# Altium footprint library WTR-PCB_LIB.PcbLib: 44 footprints (part 2 of 3)
Each footprint in its own frame and in the unit in brackets; x right, y up, seen from the top. Pads: shape width x height; smd on the part's side, far side on the other; paste and mask are expansions set on the pad; w line width, h text height; cw(c..) or ccw(c..) is an arc to the next point about the centre after c.
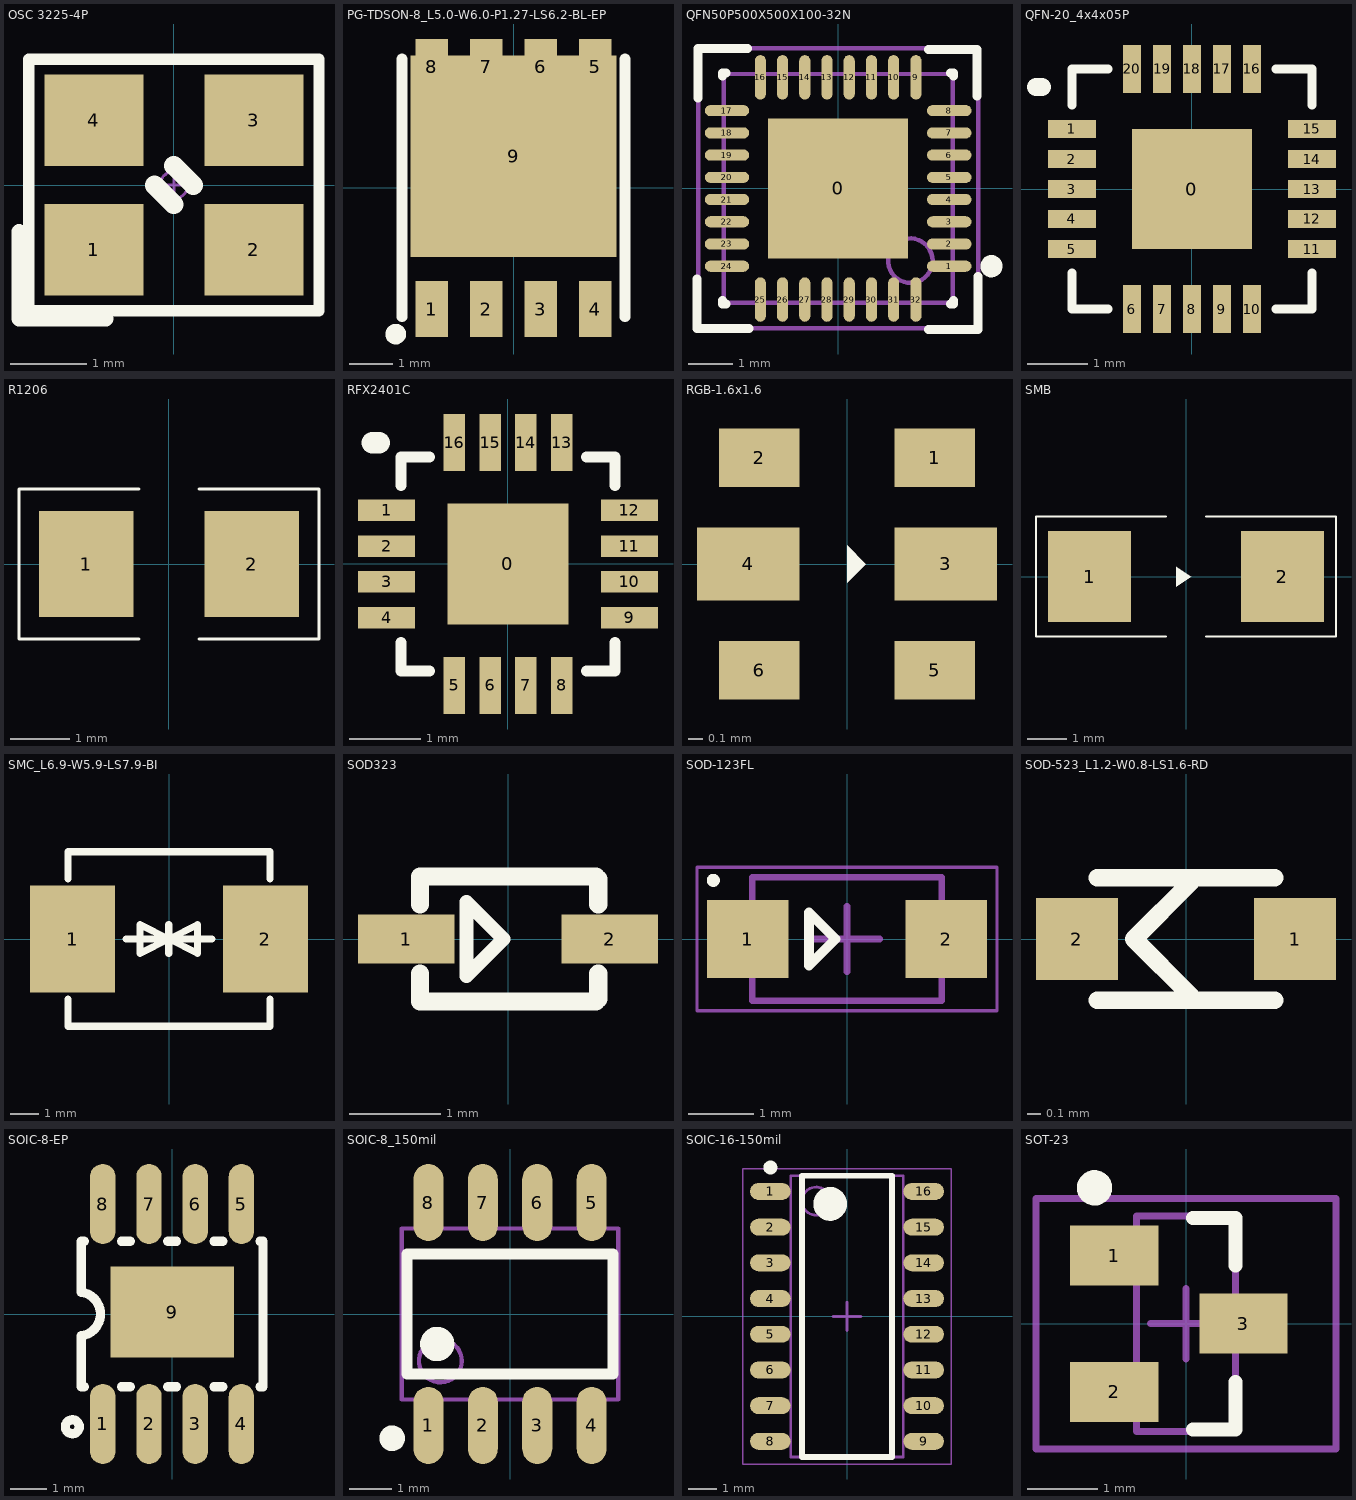
[diagram p1: the footprints below, top view; thin cyan lines are the x and y axes]

## OSC 3225-4P [mm] "3.2*2.5*0.7mm(长宽高)                         淘宝ID:黄晶宝石"
pads (4):
  rect 1.3x1.2 smd: 1(-1.05,-0.85) 2(1.05,-0.85) 3(1.05,0.85) 4(-1.05,0.85)
Top Overlay:
  lines w0.15: -1.905,-1.651 1.905,-1.651 1.905,1.651 -1.905,1.651 -1.905,-1.651
  lines w0.2: -2.032,-1.753 -0.889,-1.753 ; -2.032,-1.727 -2.032,-0.61
  lines w0.254: -0.254,0 0,-0.254 ; 0,0.254 0.254,0
Mechanical 15:
  circle w0.04: c0,0 r0.18
  lines w0.04: -0.254,0 0.254,0 ; 0,-0.254 0,0.254
3D body "OSC 3225-4.STEP": height 0.7, standoff -0.02, extent -1.6,-1.25 1.6,1.25

## PG-TDSON-8_L5.0-W6.0-P1.27-LS6.2-BL-EP [mil]
pads (9):
  rect 29.5x51.2 smd: 1(-75,-111) 2(-25,-111) 3(25,-111) 4(75,-111) 5(75,111) 6(25,111) 7(-25,111) 8(-75,111)
  rect 189x185 smd: 9(0,29)
Top Overlay:
  circle w10: c-108,-134 r4.47
  lines w10: -102.36,-118.11 -102.36,118.11 ; 102.36,-118.11 102.36,118.11

## QFN50P500X500X100-32N [mm]
pads (33):
  rect 3.15x3.15 smd: 0(0,0)
  oval 1x0.25 smd: 1(2.5,-1.75) 2(2.5,-1.25) 3(2.5,-0.75) 4(2.5,-0.25) 5(2.5,0.25) 6(2.5,0.75) 7(2.5,1.25) 8(2.5,1.75) 17(-2.5,1.75) 18(-2.5,1.25) 19(-2.5,0.75) 20(-2.5,0.25) 21(-2.5,-0.25) 22(-2.5,-0.75) 23(-2.5,-1.25) 24(-2.5,-1.75)
  oval 0.25x1 smd: 9(1.75,2.5) 10(1.25,2.5) 11(0.75,2.5) 12(0.25,2.5) 13(-0.25,2.5) 14(-0.75,2.5) 15(-1.25,2.5) 16(-1.75,2.5) 25(-1.75,-2.5) 26(-1.25,-2.5) 27(-0.75,-2.5) 28(-0.25,-2.5) 29(0.25,-2.5) 30(0.75,-2.5) 31(1.25,-2.5) 32(1.75,-2.5)
Top Overlay:
  circle w0.25: c3.45,-1.75 r0.125
  lines w0.2: -3.175,-2.032 -3.175,-3.15 -2.007,-3.15 ; -3.15,2.032 -3.15,3.15 -2.032,3.15 ; -2.6,-2.525 -2.6,-2.6 -2.525,-2.6 ; -2.6,2.525 -2.6,2.6 -2.525,2.6 ; 2.032,-3.175 3.15,-3.175 3.15,-1.981 ; 2.032,3.124 3.124,3.124 3.124,2.083 ; 2.525,-2.6 2.6,-2.6 2.6,-2.525 ; 2.525,2.6 2.6,2.6 2.6,2.525
Mechanical 13:
  circle w0.1: c1.625,-1.625 r0.5
  lines w0.1: -2.575,-2.575 -2.575,2.575 2.575,2.575 2.575,-2.575 -2.575,-2.575
Mechanical 15:
  lines w0.1: -0.5,0 0.5,0 ; 0,-0.5 0,0.5 ; -3.15,-3.15 -3.15,3.15 3.15,3.15 3.15,-3.15 -3.15,-3.15
3D body "User Library-qfn32-5x5__ _________.STEP": height 0.8, standoff 0, extent -2.501,-2.51 2.519,2.51

## QFN-20_4x4x05P [mm]
pads (21):
  rect 2x2 smd: 0(0,0)
  rect 0.8x0.3 smd: 1(-2,1) 2(-2,0.5) 3(-2,0) 4(-2,-0.5) 5(-2,-1) 11(2,-1) 12(2,-0.5) 13(2,0) 14(2,0.5) 15(2,1)
  rect 0.3x0.8 smd: 6(-1,-2) 7(-0.5,-2) 8(0,-2) 9(0.5,-2) 10(1,-2) 16(1,2) 17(0.5,2) 18(0,2) 19(-0.5,2) 20(-1,2)
Top Overlay:
  lines w0.152: -2,-1.4 -2,-2 -1.4,-2 ; -2,1.4 -2,2 -1.4,2 ; 1.4,-2 2,-2 2,-1.4 ; 1.4,2 2,2 2,1.4
  lines w0.3: -2.6,1.7 -2.5,1.7
3D body "User Library-QFN20_4x4x0_8.STEP": height 0.78, standoff -0.02, extent -2.01,-2.01 2.01,2.01

## R1206 [mm]
height 1
pads (2):
  rect 1.6x1.8 smd: 1(-1.4,0) 2(1.4,0)
Top Overlay:
  lines w0.051: -0.508,-1.27 -2.54,-1.27 -2.54,1.27 -0.508,1.27 ; 0.508,-1.27 2.54,-1.27 2.54,1.27 0.508,1.27
3D body "R1206封?": height 1, standoff -0.01, extent -1.6,-0.813 1.6,0.797

## RFX2401C [mm]
pads (17):
  rect 1.7x1.7 smd: 0(0,0)
  rect 0.8x0.3 smd: 1(-1.7,0.75) 2(-1.7,0.25) 3(-1.7,-0.25) 4(-1.7,-0.75) 9(1.7,-0.75) 10(1.7,-0.25) 11(1.7,0.25) 12(1.7,0.75)
  rect 0.3x0.8 smd: 5(-0.75,-1.7) 6(-0.25,-1.7) 7(0.25,-1.7) 8(0.75,-1.7) 13(0.75,1.7) 14(0.25,1.7) 15(-0.25,1.7) 16(-0.75,1.7)
Top Overlay:
  lines w0.152: -1.5,-1.1 -1.5,-1.5 -1.1,-1.5 ; -1.5,1.1 -1.5,1.5 -1.1,1.5 ; 1.1,-1.5 1.5,-1.5 1.5,-1.1 ; 1.1,1.5 1.5,1.5 1.5,1.1
  lines w0.3: -1.9,1.7 -1.8,1.7
3D body: height 0.25, standoff 0, extent 1.016,0.635 1.016,0.635
3D body: height 0.25, standoff 0, extent 1.016,0.635 1.016,0.635
3D body "ALSRobot-QFN16 3x3.STEP": height 0.9, standoff 0, extent -1.521,-1.518 1.521,1.524

## RGB-1.6x1.6 [mm]
pads (6):
  rect 0.55x0.4 smd: 1(0.6,0.725) 2(-0.6,0.725) 5(0.6,-0.725) 6(-0.6,-0.725)
  rect 0.7x0.5 smd: 3(0.675,0) 4(-0.675,0)
Top Layer:
  region: -0.127,0.762 -0.127,0.889
Top Overlay:
  region: 0,0.127 0,-0.127 0.127,0

## SMB [mm]
height 1
pads (2):
  rect 2.1x2.3 smd: 1(-2.45,0) 2(2.45,0)
Top Layer:
  region: -0.254,-0.254 -0.127,-0.254
  pour cut-out: 1.524,2.159
Top Overlay:
  region: -0.254,0.254 -0.254,-0.254 0.127,0
  lines w0.051: -0.508,-1.524 -3.81,-1.524 -3.81,1.524 -0.508,1.524 ; 0.508,-1.524 3.81,-1.524 3.81,1.524 0.508,1.524
3D body "SMBJ30A.stp": height 2.61, standoff 0, extent -2.7,-1.81 2.7,1.81

## SMC_L6.9-W5.9-LS7.9-BI [mm]
pads (2):
  rect 3.03x3.82 smd: 1(-3.435,0) 2(3.435,0)
Top Overlay:
  lines w0.254: -3.6,-2.141 -3.6,-3.11 3.6,-3.11 3.6,-2.141 ; -3.6,2.141 -3.6,3.11 3.6,3.11 3.6,2.141 ; -1.536,0 0.496,0 ; -0.508,0 1.524,0 ; -0.012,-0.508 -0.012,0.508 -0.012,0 ; 0,0.508 0,-0.508 0,0 ; -0.012,0 -1.028,0.508 -1.028,-0.508 -0.012,0 ; 0,0 1.016,0.508 1.016,-0.508 0,0

## SOD323 [mm]
pads (2):
  rect 1.06x0.54 smd: 1(-1.118,0) 2(1.118,0)
Top Overlay:
  lines w0.152: -0.457,-0.406 -0.051,0 -0.457,0.406 -0.457,-0.406
  lines w0.2: -0.965,-0.381 -0.965,-0.686 0.965,-0.686 ; -0.965,0.381 -0.965,0.686 0.965,0.686 ; 0.991,-0.66 0.991,-0.381 ; 0.991,0.381 0.991,0.66
3D body "User Library-SOD2513X11.STEP": height 1.1, standoff 0, extent -1.35,-0.615 1.35,0.635

## SOD-123FL [mm] "SODFL, 2-Leads, Body 1.80x3.70mm, IPC Medium Density"
height 1.1
pads (2):
  rect 1.25x1.2 smd: 1(-1.525,0) 2(1.525,0)
Top Overlay:
  circle w0.1: c-2.05,0.9 r0.05
  lines w0.152: -0.584,-0.406 -0.178,0 -0.584,0.406 -0.584,-0.406
Top Assembly:
  lines w0.1: -1.45,-0.95 1.45,-0.95 1.45,0.95 -1.45,0.95 -1.45,-0.95
Top Courtyard:
  lines w0.05: -2.3,-1.1 2.3,-1.1 2.3,1.1 -2.3,1.1 -2.3,-1.1
  lines w0.1: -0.5,0 0.5,0 ; 0,-0.5 0,0.5
3D body: height 1.1, standoff 0, extent -1.45,-0.95 1.45,0.95

## SOD-523_L1.2-W0.8-LS1.6-RD [mm]
pads (2):
  rect 0.6x0.6 smd: 1(0.8,0) 2(-0.8,0)
Top Overlay:
  lines w0.13: -0.65,-0.45 0.65,-0.45 ; -0.65,0.45 0.65,0.45 ; 0.035,-0.416 -0.381,0 0.035,0.416

## SOIC-8-EP [mm]
pads (9):
  oval 0.7x2.2 smd: 1(-1.905,-3.023) 2(-0.635,-3.023) 3(0.635,-3.023) 4(1.905,-3.023) 5(1.905,3.023) 6(0.635,3.023) 7(-0.635,3.023) 8(-1.905,3.023)
  rect 3.4x2.5 smd: 9(0,0.051)
Top Overlay:
  circle w0.254: c-2.743,-3.099 r0.191
  lines w0.254: -2.418,-2 -2.5,-2 -2.5,-0.6 ccw(c-2.572,0) -2.499,0.599 -2.5,2 -2.418,2 ; -1.392,-2 -1.148,-2 ; -1.392,2 -1.148,2 ; -0.122,-2 0.122,-2 ; -0.122,2 0.122,2 ; 1.148,-2 1.392,-2 ; 1.148,2 1.392,2 ; 2.418,-2 2.5,-2 2.5,2 2.418,2

## SOIC-8_150mil [mm]
height 1.3
pads (8):
  oval 0.7x1.8 smd: 1(-1.905,-2.6) 2(-0.635,-2.6) 3(0.635,-2.6) 4(1.905,-2.6) 5(1.905,2.6) 6(0.635,2.6) 7(-0.635,2.6) 8(-1.905,2.6)
Top Overlay:
  circle w0.4: c-1.7,-0.7 r0.2
  circle w0.3: c-2.75,-2.9 r0.15
  lines w0.254: -2.4,-1.4 -2.4,1.4 2.4,1.4 2.4,-1.4 -2.4,-1.4
Mechanical 13:
  circle w0.1: c-1.625,-1.095 r0.5
  lines w0.1: -2.525,-1.995 -2.525,1.995 2.525,1.995 2.525,-1.995 -2.525,-1.995
3D body "User Library-so8-3.STEP": height 1.7, standoff 0, extent -2.45,-3 2.45,3

## SOIC-16-150mil [mm] "SOIC, 16-Leads, Body 9.90x3.90mm, Pitch 1.27mm, IPC Medium Density"
height 1.75
pads (16):
  oval 1.45x0.6 smd: 1(-2.725,4.445) 2(-2.725,3.175) 3(-2.725,1.905) 4(-2.725,0.635) 5(-2.725,-0.635) 6(-2.725,-1.905) 7(-2.725,-3.175) 8(-2.725,-4.445) 9(2.725,-4.445) 10(2.725,-3.175) 11(2.725,-1.905) 12(2.725,-0.635) 13(2.725,0.635) 14(2.725,1.905) 15(2.725,3.175) 16(2.725,4.445)
Top Overlay:
  circle w0.25: c-2.725,5.295 r0.125
  circle w0.6: c-0.6,4 r0.3
  lines w0.2: -1.6,-5 -1.6,5 1.6,5 1.6,-5 -1.6,-5
Top Assembly:
  circle w0.1: c-1.1,4.1 r0.5
  lines w0.1: -2,-5 -2,5 2,5 2,-5 -2,-5
Top Courtyard:
  lines w0.05: -3.7,-5.25 -3.7,5.25 3.7,5.25 3.7,-5.25 -3.7,-5.25
  lines w0.1: -0.5,0 0.5,0 ; 0,-0.5 0,0.5
3D body "User Library-SOIC16-150.STEP": height 1.75, standoff 0, extent -2.9,-4.9 2.9,4.9

## SOT-23 [mm]
pads (3):
  rect 1.25x0.85 smd: 1(-1.016,0.965) 2(-1.016,-0.965) 3(0.813,0)
Top Overlay:
  circle w0.25: c-1.295,1.925 r0.125
  lines w0.2: 0.1,-1.5 0.7,-1.5 0.7,-0.825 ; 0.1,1.5 0.7,1.5 0.7,0.825
Mechanical 13:
  lines w0.1: -0.7,-1.525 -0.7,1.525 0.7,1.525 0.7,-1.525 -0.7,-1.525
Mechanical 15:
  lines w0.1: -0.5,0 0.5,0 ; 0,-0.5 0,0.5 ; -2.125,-1.775 -2.125,1.775 2.125,1.775 2.125,-1.775 -2.125,-1.775
3D body "SOT-23封?": height 1.04, standoff -0.03, extent -1.124,-1.473 1.174,1.447